# Altium footprint library CMR_Connectors.PcbLib: 71 footprints (part 4 of 5)
Each footprint in its own frame and in the unit in brackets; x right, y up, seen from the top. Pads: shape width x height; smd on the part's side, far side on the other; paste and mask are expansions set on the pad; w line width, h text height; cw(c..) or ccw(c..) is an arc to the next point about the centre after c.
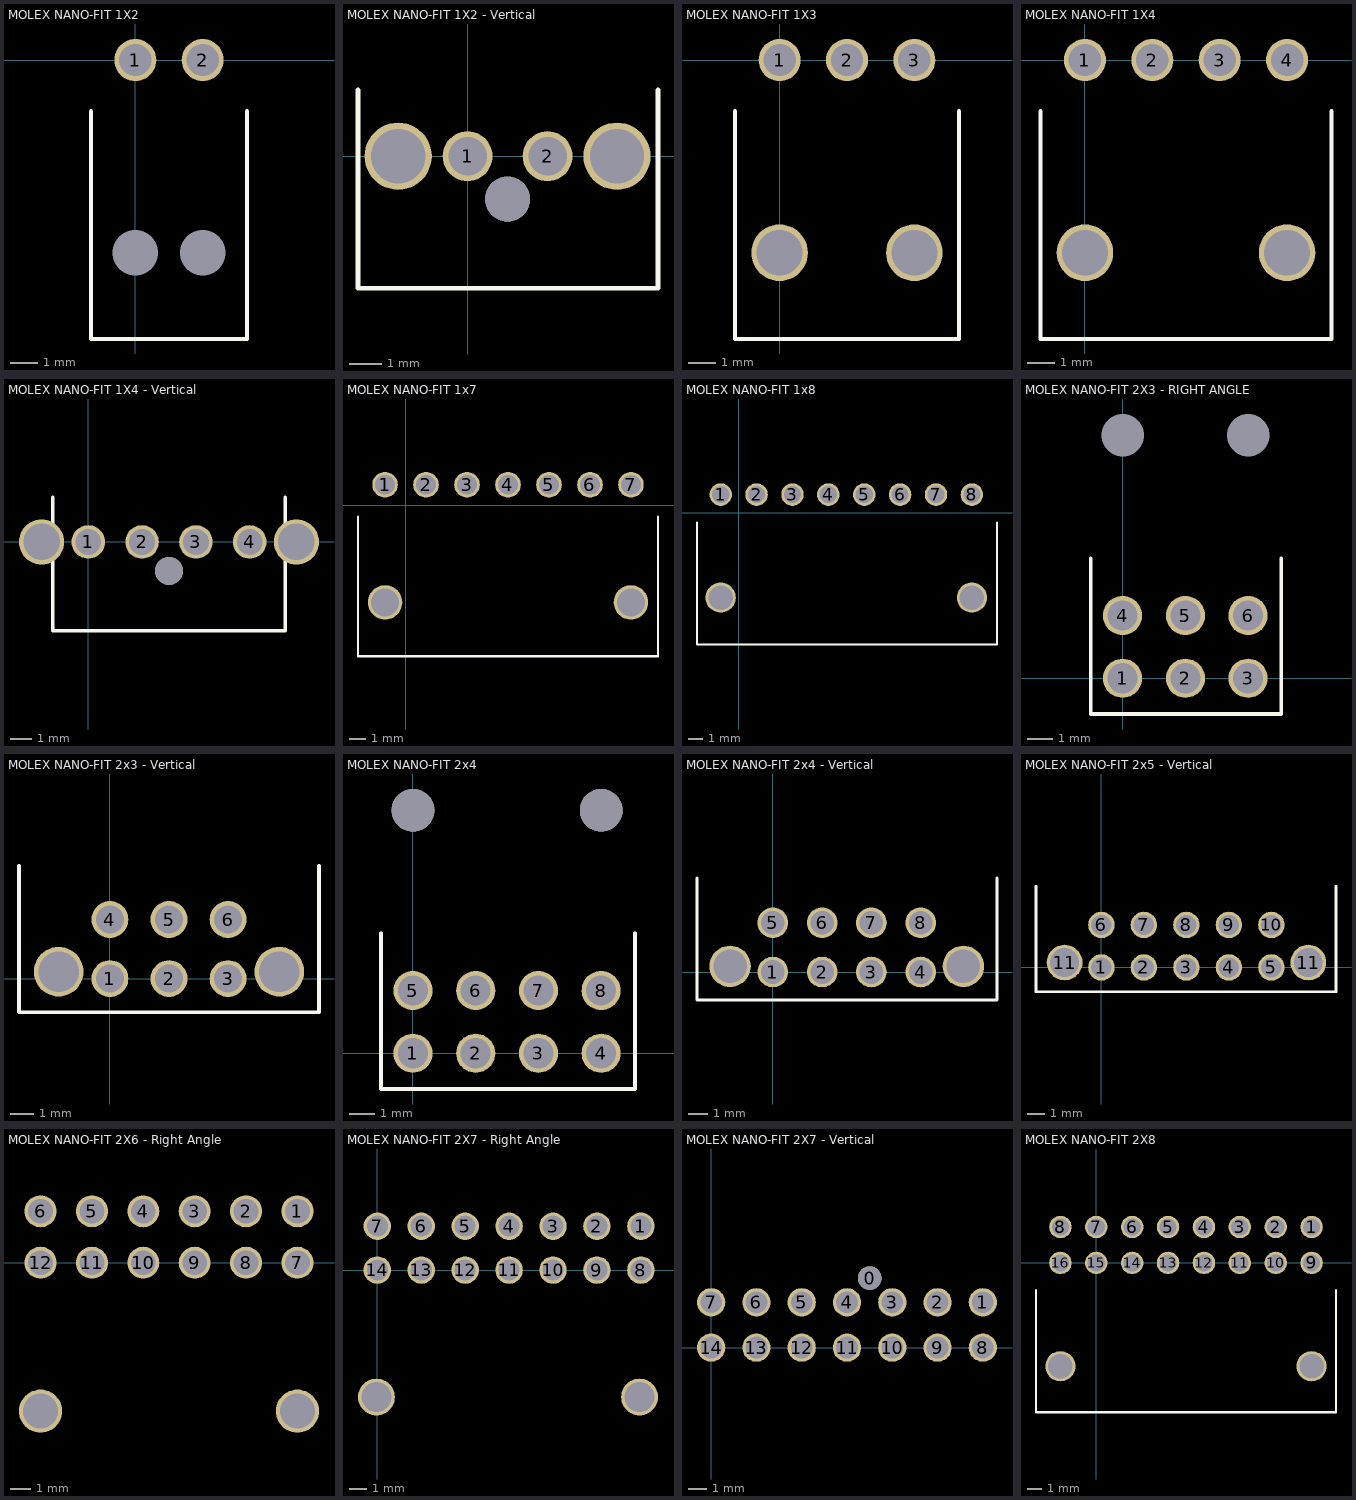
[diagram p3: the footprints below, top view; thin cyan lines are the x and y axes]

## MOLEX NANO-FIT 1X2 [mm]
pads (4):
  round 1.56 hole 1.2: 1(0,0) 2(2.5,0)
  round 0 hole 1.7 unplated: ""(0,-7.15) ""(2.5,-7.15)
Top Overlay:
  lines w0.15: -1.65,-1.9 -1.65,-10.35 4.15,-10.35 4.15,-1.9
3D body "1053071202.stp": height 7.46, standoff -0.5, extent -2.675,-25.85 5.025,-10.15
3D body "1053131202.stp": height 6.6, standoff -3.24, extent -1.72,-11.829 4.22,0.329

## MOLEX NANO-FIT 1X2 - Vertical [mm] "MOLEX NANO-FIT 1X2 - Vertical with Solder Clips"
pads (5):
  round 1.56 hole 1.2: 1(0,0) 2(2.5,0)
  round 2.1 hole 1.7: ""(-2.17,0) ""(4.67,0)
  round 1.4 hole 1.4 unplated: ""(1.25,-1.34)
Top Overlay:
  lines w0.15: -3.425,2.075 -3.425,-4.125 5.95,-4.125 5.95,2.075
3D body "1053111102.stp": height 10.68, standoff -3.03, extent -2.845,-4.62 5.375,1.72
3D body "1053071202.stp": height 24.85, standoff 9.15, extent -2.585,-5.43 5.115,2.53

## MOLEX NANO-FIT 1X3 [mm]
pads (5):
  round 1.56 hole 1.2: 1(0,0) 2(2.5,0) 3(5,0)
  round 2.1 hole 1.7: ""(0,-7.15) ""(5,-7.15)
Top Overlay:
  lines w0.15: -1.65,-1.9 -1.65,-10.35 6.65,-10.35 6.65,-1.9
3D body "1053131303.stp": height 6.6, standoff -3.24, extent -1.72,-11.84 6.72,0.318
3D body "1053071203.stp": height 7.56, standoff -0.4, extent -2.6,-26.115 7.6,-10.415
3D body: height 0.25, standoff 0, extent 10.975,-5.1 10.975,-5.1

## MOLEX NANO-FIT 1X4 [mm]
pads (6):
  round 1.56 hole 1.2: 1(0,0) 2(2.5,0) 3(5,0) 4(7.5,0)
  round 2.1 hole 1.7: ""(0,-7.15) ""(7.5,-7.15)
Top Overlay:
  lines w0.15: -1.65,-1.9 -1.65,-10.35 9.15,-10.35 9.15,-1.9
3D body "1053071204.stp": height 7.56, standoff -0.4, extent -2.65,-26.075 10.05,-10.375
3D body "1053131204.stp": height 6.6, standoff -3.24, extent -1.72,-11.94 9.22,0.218

## MOLEX NANO-FIT 1X4 - Vertical [mm] "MOLEX NANO-FIT 1X4 - Vertical with Solder Clips"
pads (7):
  round 1.56 hole 1.2: 1(0,0) 2(2.5,0) 3(5,0) 4(7.5,0)
  round 2.1 hole 1.7: ""(-2.17,0) ""(9.67,0)
  round 1.3 hole 1.3 unplated: ""(3.75,-1.34)
Top Overlay:
  lines w0.15: -1.65,2.075 -1.65,-4.125 9.15,-4.125 9.15,2.075
3D body "1053111304.stp": height 10.68, standoff -3.03, extent -2.86,-4.665 10.36,1.675
3D body "1053071204.stp": height 25.05, standoff 9.35, extent -2.6,-5.445 10.1,2.515

## MOLEX NANO-FIT 1x7 [mm]
pads (9):
  round 1.56 hole 1.2: 1(-1.25,1.25) 2(1.25,1.25) 3(3.75,1.25) 4(6.25,1.25) 5(8.75,1.25) 6(11.25,1.25) 7(13.75,1.25)
  round 2.1 hole 1.7: ""(-1.25,-5.925) ""(13.75,-5.925)
Top Overlay:
  lines w0.15: -2.9,-0.7 -2.9,-9.2 15.4,-9.2 15.4,-0.7
3D body "1053071207.stp": height 7.56, standoff -0.4, extent -3.825,-24.925 16.375,-9.225
3D body "1053131207.stp": height 6.6, standoff -3.24, extent -2.97,-10.55 15.47,1.608

## MOLEX NANO-FIT 1x8 [mm]
pads (10):
  oval 1.56x1.57 hole 1.2: 1(-1.25,1.25) 2(1.25,1.25) 3(3.75,1.25) 4(6.25,1.25) 5(8.75,1.25) 6(11.25,1.25) 7(13.75,1.25) 8(16.25,1.25)
  round 2.1 hole 1.7: ""(-1.25,-5.925) ""(16.25,-5.925)
Top Overlay:
  lines w0.15: -2.9,-0.7 -2.9,-9.2 18,-9.2 18,-0.7
3D body "1053131208.stp": height 6.6, standoff -3.24, extent -2.97,-10.69 17.97,1.468
3D body "1053071208.stp": height 7.36, standoff -0.6, extent -3.825,-25.075 18.875,-9.375

## MOLEX NANO-FIT 2X3 - RIGHT ANGLE [mm] "MOLEX NANO-FIT 2X3 - Right Angle"
height 9.14
pads (8):
  round 1.56 hole 1.2: 1(0,0) 2(2.5,0) 3(5,0) 4(0,2.5) 5(2.5,2.5) 6(5,2.5)
  round 0 hole 1.7: ""(0,9.68) ""(5,9.68)
Top Overlay:
  lines w0.15: -1.275,4.775 -1.275,-1.425 6.325,-1.425 6.325,4.775
3D body "1053081206.stp": height 10.01, standoff -0.45, extent -2.6,13.15 7.6,28.85
3D body "1053141206.stp": height 9.15, standoff -3.19, extent -1.72,-0.318 6.72,14.34

## MOLEX NANO-FIT 2x3 - Vertical [mm] "MOLEX NANO-FIT 2X3 - Vertical with Solder Clips"
pads (8):
  round 1.56 hole 1.2: 1(0,0) 2(2.5,0) 3(5,0) 4(0,2.5) 5(2.5,2.5) 6(5,2.5)
  round 2.1 hole 1.7: ""(-2.17,0.29) ""(7.17,0.29)
Top Overlay:
  lines w0.15: -3.85,4.775 -3.85,-1.425 8.85,-1.425 8.85,4.775
3D body "1053121206.stp": height 10.69, standoff -3.03, extent -2.96,-4.55 7.76,4.29
3D body "1053081206.stp": height 26.85, standoff 11.15, extent -3,-4.68 7.2,5.78

## MOLEX NANO-FIT 2x4 [mm] "MOLEX NANO-FIT 2X4"
pads (10):
  round 1.56 hole 1.2: 1(0,0) 2(2.5,0) 3(5,0) 4(7.5,0) 5(0,2.5) 6(2.5,2.5) 7(5,2.5) 8(7.5,2.5)
  round 1.7 hole 1.7: ""(0,9.68) ""(7.5,9.68)
Top Overlay:
  lines w0.15: -1.275,4.775 -1.275,-1.425 8.85,-1.425 8.85,4.775
3D body "1053081208.stp": height 10.71, standoff 0.25, extent -2.6,14.15 10.1,29.85
3D body "1053141308.stp": height 9.85, standoff -2.49, extent -1.72,-0.442 9.22,14.215

## MOLEX NANO-FIT 2x4 - Vertical [mm] "MOLEX NANO-FIT 2X4 - Vertical with Solder Clips"
pads (10):
  round 1.56 hole 1.2: 1(0,0) 2(2.5,0) 3(5,0) 4(7.5,0) 5(0,2.5) 6(2.5,2.5) 7(5,2.5) 8(7.5,2.5)
  round 2.1 hole 1.7: ""(-2.17,0.29) ""(9.67,0.29)
Top Overlay:
  lines w0.15: -3.85,4.775 -3.85,-1.425 11.375,-1.425 11.375,4.775
3D body "nanofit_2x4_plug.stp": height 25.85, standoff 10.15, extent -2.525,-5.335 10.175,5.125
3D body "nanofit_2x4_vertical_header.stp": height 10.19, standoff -3.53, extent -3.02,-4.72 10.2,4.12

## MOLEX NANO-FIT 2x5 - Vertical [mm] "MOLEX NANO-FIT 2X5 - Vertical with Solder Clips"
pads (12):
  round 1.56 hole 1.2: 1(0,0) 2(2.5,0) 3(5,0) 4(7.5,0) 5(10,0) 6(0,2.5) 7(2.5,2.5) 8(5,2.5) 9(7.5,2.5) 10(10,2.5)
  round 2.1 hole 1.7: 11(-2.17,0.29) 11(12.17,0.29)
Top Overlay:
  lines w0.15: -3.85,4.775 -3.85,-1.425 13.8,-1.425 13.8,4.775
3D body "1053081210.stp": height 26.85, standoff 11.15, extent -2.7,-5.66 12.5,4.8
3D body "1053121310.stp": height 10.19, standoff -3.53, extent -2.76,-4.6 12.96,4.24

## MOLEX NANO-FIT 2X6 - Right Angle [mm]
pads (14):
  round 1.56 hole 1.2: 1(15,2.5) 2(12.5,2.5) 3(10,2.5) 4(7.5,2.5) 5(5,2.5) 6(2.5,2.5) 7(15,0) 8(12.5,0) 9(10,0) 10(7.5,0) 11(5,0) 12(2.5,0)
  round 2.1 hole 1.7: ""(2.5,-7.225) ""(15,-7.225)
3D body "1053141312.stp": height 9.12, standoff -3.22, extent 0.775,-11.879 16.715,2.779
3D body "1053081212.stp": height 9.98, standoff -0.48, extent -0.2,-28.975 17.5,-13.275

## MOLEX NANO-FIT 2X7 - Right Angle [mm]
pads (16):
  round 1.56 hole 1.2: 1(15,2.5) 2(12.5,2.5) 3(10,2.5) 4(7.5,2.5) 5(5,2.5) 6(2.5,2.5) 7(0,2.5) 8(15,0) 9(12.5,0) 10(10,0) 11(7.5,0) 12(5,0) 13(2.5,0) 14(0,0)
  round 2.1 hole 1.7: ""(-0.05,-7.225) ""(14.925,-7.225)
3D body "1053141214.stp": height 9.35, standoff -2.99, extent -1.795,-11.882 16.645,2.775
3D body "1053081214.stp": height 10.21, standoff -0.25, extent -2.675,-26.05 17.525,-10.35

## MOLEX NANO-FIT 2X7 - Vertical [mm]
pads (15):
  round 1.3 hole 1.3: 0(8.75,3.84)
  round 1.56 hole 1.2: 1(15,2.5) 2(12.5,2.5) 3(10,2.5) 4(7.5,2.5) 5(5,2.5) 6(2.5,2.5) 7(0,2.5) 8(15,0) 9(12.5,0) 10(10,0) 11(7.5,0) 12(5,0) 13(2.5,0) 14(0,0)
3D body "1053081214.stp": height 26.85, standoff 11.15, extent -2.35,-2.2 17.85,8.26
3D body "1053101314.stp": height 10.18, standoff -3.53, extent -1.77,-1.74 16.67,7.1

## MOLEX NANO-FIT 2X8 [mm]
pads (18):
  round 1.56 hole 1.2: 1(15,2.5) 2(12.5,2.5) 3(10,2.5) 4(7.5,2.5) 5(5,2.5) 6(2.5,2.5) 7(0,2.5) 8(-2.5,2.5) 9(15,0) 10(12.5,0) 11(10,0) 12(7.5,0) 13(5,0) 14(2.5,0) 15(0,0) 16(-2.5,0)
  round 2.1 hole 1.7: ""(-2.5,-7.2) ""(15,-7.2)
Top Overlay:
  lines w0.15: -4.2,-1.9 -4.2,-10.4 16.7,-10.4 16.7,-1.9
3D body "1053142316.stp": height 5.85, standoff -6.49, extent -4.225,-11.7 16.715,2.957
3D body "1053081216.stp": height 6.86, standoff -3.6, extent -5.075,-26.2 17.625,-10.5